# Altium schematic symbol library lib_datalogger.SchLib: 1246 symbols (part 9 of 16)
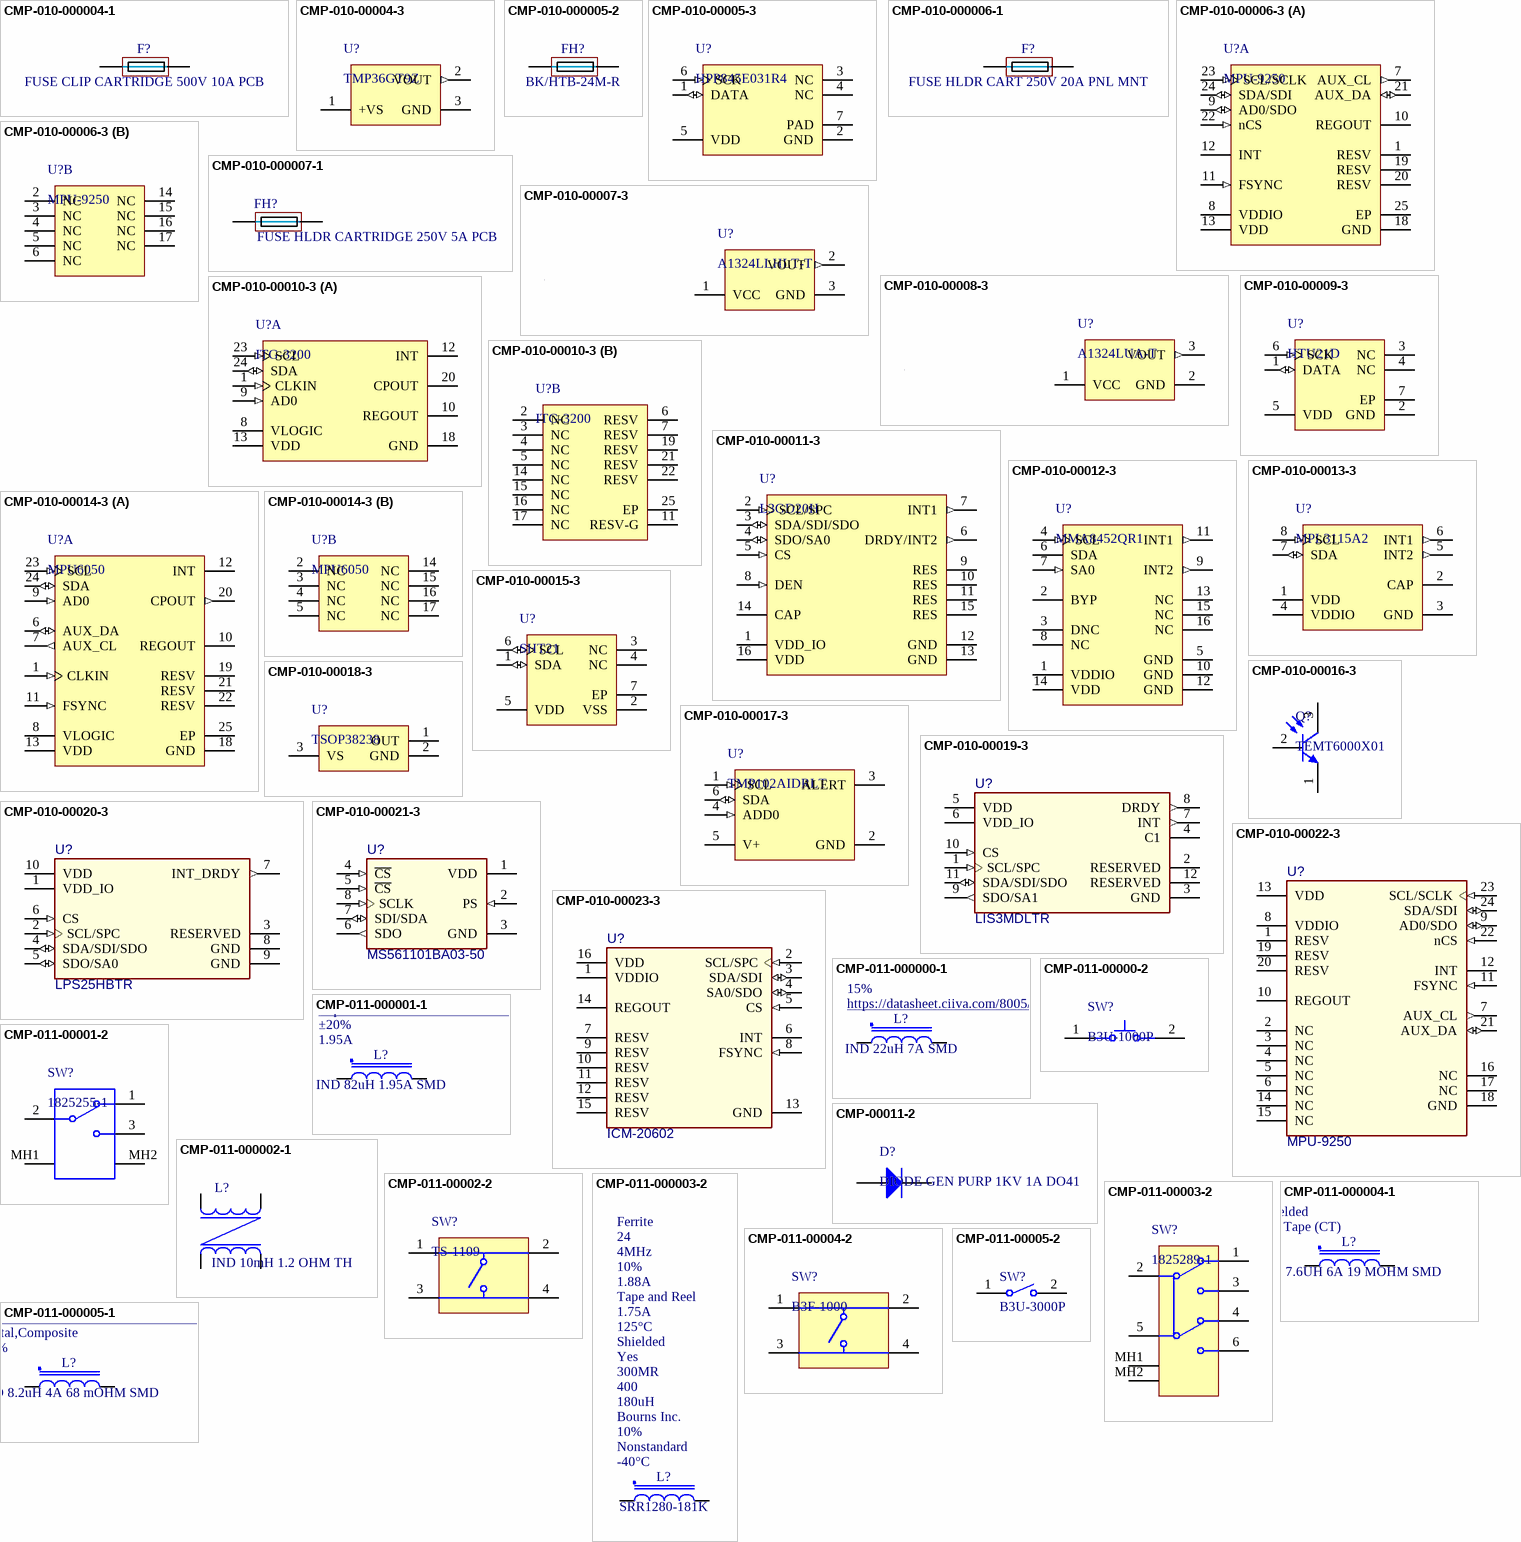
[diagram p51: symbols CMP-010-000004-1 to CMP-011-00005-2]

## CMP-011-00004-2
designator SW?, comment B3F-1000
Tactile Switch, SPST-NO, 0.05 A, 24 V, -25 to 70 degC, 4-Pin THD, RoHS, Bulk; Manufacturer: Omron Electronic Components; Throw Configuration: SPST; Max Contact Resistance: 100mohm; Resistance: 0.1Ohm; Max Current Rating: 50mA; Voltage Rating: 24V; Operating Force: 100gf; Datasheet Version: Jan-15; Case/Package: B3F-1000; Packaging: Bulk; Package Description: 4-Pin Through Hole Device, Body 6 x 6 mm; Manufacturer URL: http://www.omron.com/; Package Reference: B3F-1000; Contact Plating: Gold; Contact Current Rating: 50mA; RoHS Compliant: True; Contact Material: Gold; Mounting Technology: TH; Max Operating Temperature: 70°C; Min Operating Temperature: -25°C; Package Quantity: 1500; Datasheet URL: http://www.omron.com/ecb/products/pdf/en-b3f.pdf; Voltage Rating (DC): 24V; Pins: 4; Current Rating: 50mA; Max Voltage Rating (DC): 24V
footprint OMRON-B3F-1000-4_V (TH, 4-Leads, Body 6x6mm)
pins: 1, 2, 3, 4

## CMP-011-000005-1
designator L?, comment IND 8.2uH 4A 68 mOHM SMD  Inductance Tolerance: 20%  Core Material: Metal,Composite  Max Operating Temperature: 125°C  Shielding: Shielded  Case/Package: 2525  Inductance: 8.2uH  Current Rating: 4A  Packaging: Tape and Reel  Min Operating Temperature: -55°C  Package Quantity: 2000  Self Resonant Frequency: 5MHz  Saturation Current: 7.5A  Manufacturer: Vishay Dale
IHLP 2525 Inductor, 8.2uH, 4A, 64mOhm; Manufacturer Part Number: IHLP2525CZER8R2M01; DC Resistance (DCR): 68mR; Test Frequency: 100kHz; ComponentLink1URL: https://datasheet.ciiva.com/11798/0900766b8102c934-11798421.pdf?src-supplier=RSComponents; ComponentLink3Description: https://datasheet.ciiva.com/8017/lp25cz01-8017605.pdf?src-supplier=Element14; Mount: Surface Mount; ComponentLink6Description: https://datasheet.ciiva.com/3081/lp25cz01-3081990.pdf?src-supplier=Avnet; ComponentLink5URL: https://datasheet.ciiva.com/16348/lp25cz01-16348924.pdf?src-supplier=Future+Electronics; ComponentLink1Description: https://datasheet.ciiva.com/11798/0900766b8102c934-11798421.pdf?src-supplier=RSComponents; Radiation Hardening: No; Height - Seated (Max): 0.118inch; Max DC Current: 7.5A; Contact Plating: Tin; REACH SVHC: Unknown; RMS Current (Irms): 4A; ComponentLink4Description: https://datasheet.ciiva.com/17269/lp25cz01-17269445.pdf?src-supplier=Avnet+Europe; Width: 6.47mm; Stock 1: 10573; ComponentLink5Description: https://datasheet.ciiva.com/16348/lp25cz01-16348924.pdf?src-supplier=Future+Electronics; Design Item ID: IND 8.2uH 4A 68 mOHM SMD; Lead Free: Lead Free; ComponentLink2URL: https://datasheet.ciiva.com/26793/ihlp2525czer8r2m01-26793549.pdf?src-supplier=IIIC; RoHS: Yes; Source: mits.SchLib; Pricing 1: 1=2,73000, 10=2,51900, 100=1,76300, 500=1,42716, 1000=1,30123 (USD); Tolerance: 20%; Termination: SMD/SMT; Number of Pins: 2; ComponentLink4URL: https://datasheet.ciiva.com/17269/lp25cz01-17269445.pdf?src-supplier=Avnet+Europe; ComponentLink3URL: https://datasheet.ciiva.com/8017/lp25cz01-8017605.pdf?src-supplier=Element14; Depth: 6.72mm; Height: 3mm; ComponentLink7Description: https://datasheet.ciiva.com/46393/1913191-46393003.pdf?src-supplier=Element14; ComponentLink2Description: https://datasheet.ciiva.com/26793/ihlp2525czer8r2m01-26793549.pdf?src-supplier=IIIC; Category: Ferrite Beads and Chips; ComponentLink7URL: https://datasheet.ciiva.com/46393/1913191-46393003.pdf?src-supplier=Element14; Length: 7.24mm; ComponentLink6URL: https://datasheet.ciiva.com/3081/lp25cz01-3081990.pdf?src-supplier=Avnet; Military Standard: Not
footprint IND 6.47MM_6.47MM
pins: 1, 2

## CMP-011-00005-2
designator SW?, comment B3U-3000P
Tactile Switch, SPST-NO, 0.05 A, 12 V, -25 to 70 degC, 2-Pin SMD, RoHS, Tape and Reel; Manufacturer: Omron Electronic Components; Operating Force: 162gf; Voltage Rating (DC): 12V; Current Rating: 50mA; IP Rating: IP40; Throw Configuration: SPST; Max Contact Resistance: 100mohm; RoHS Compliant: True; Contact Current Rating: 50mA; Manufacturer URL: http://www.omron.com/; Packaging: TapeandReel; Max Voltage Rating (DC): 12V; Contact Material: Silver; Datasheet Version: Jan-15; Package Reference: B3U-3000P; Package Description: 2-Pin Surface Mount Device, Body 4 x 3.2 mm; Min Operating Temperature: -25°C; Package Quantity: 4000; Max Operating Temperature: 70°C; Max Current Rating: 50mA; Voltage Rating: 12V; Case/Package: B3U-3000P; Mounting Technology: SM; Datasheet URL: https://www.omron.com/ecb/products/pdf/en-b3u.pdf
footprint OMRON-B3U-3000P_V (SMD, 2-Leads, Body 4x3.2mm)
pins: 1, 2

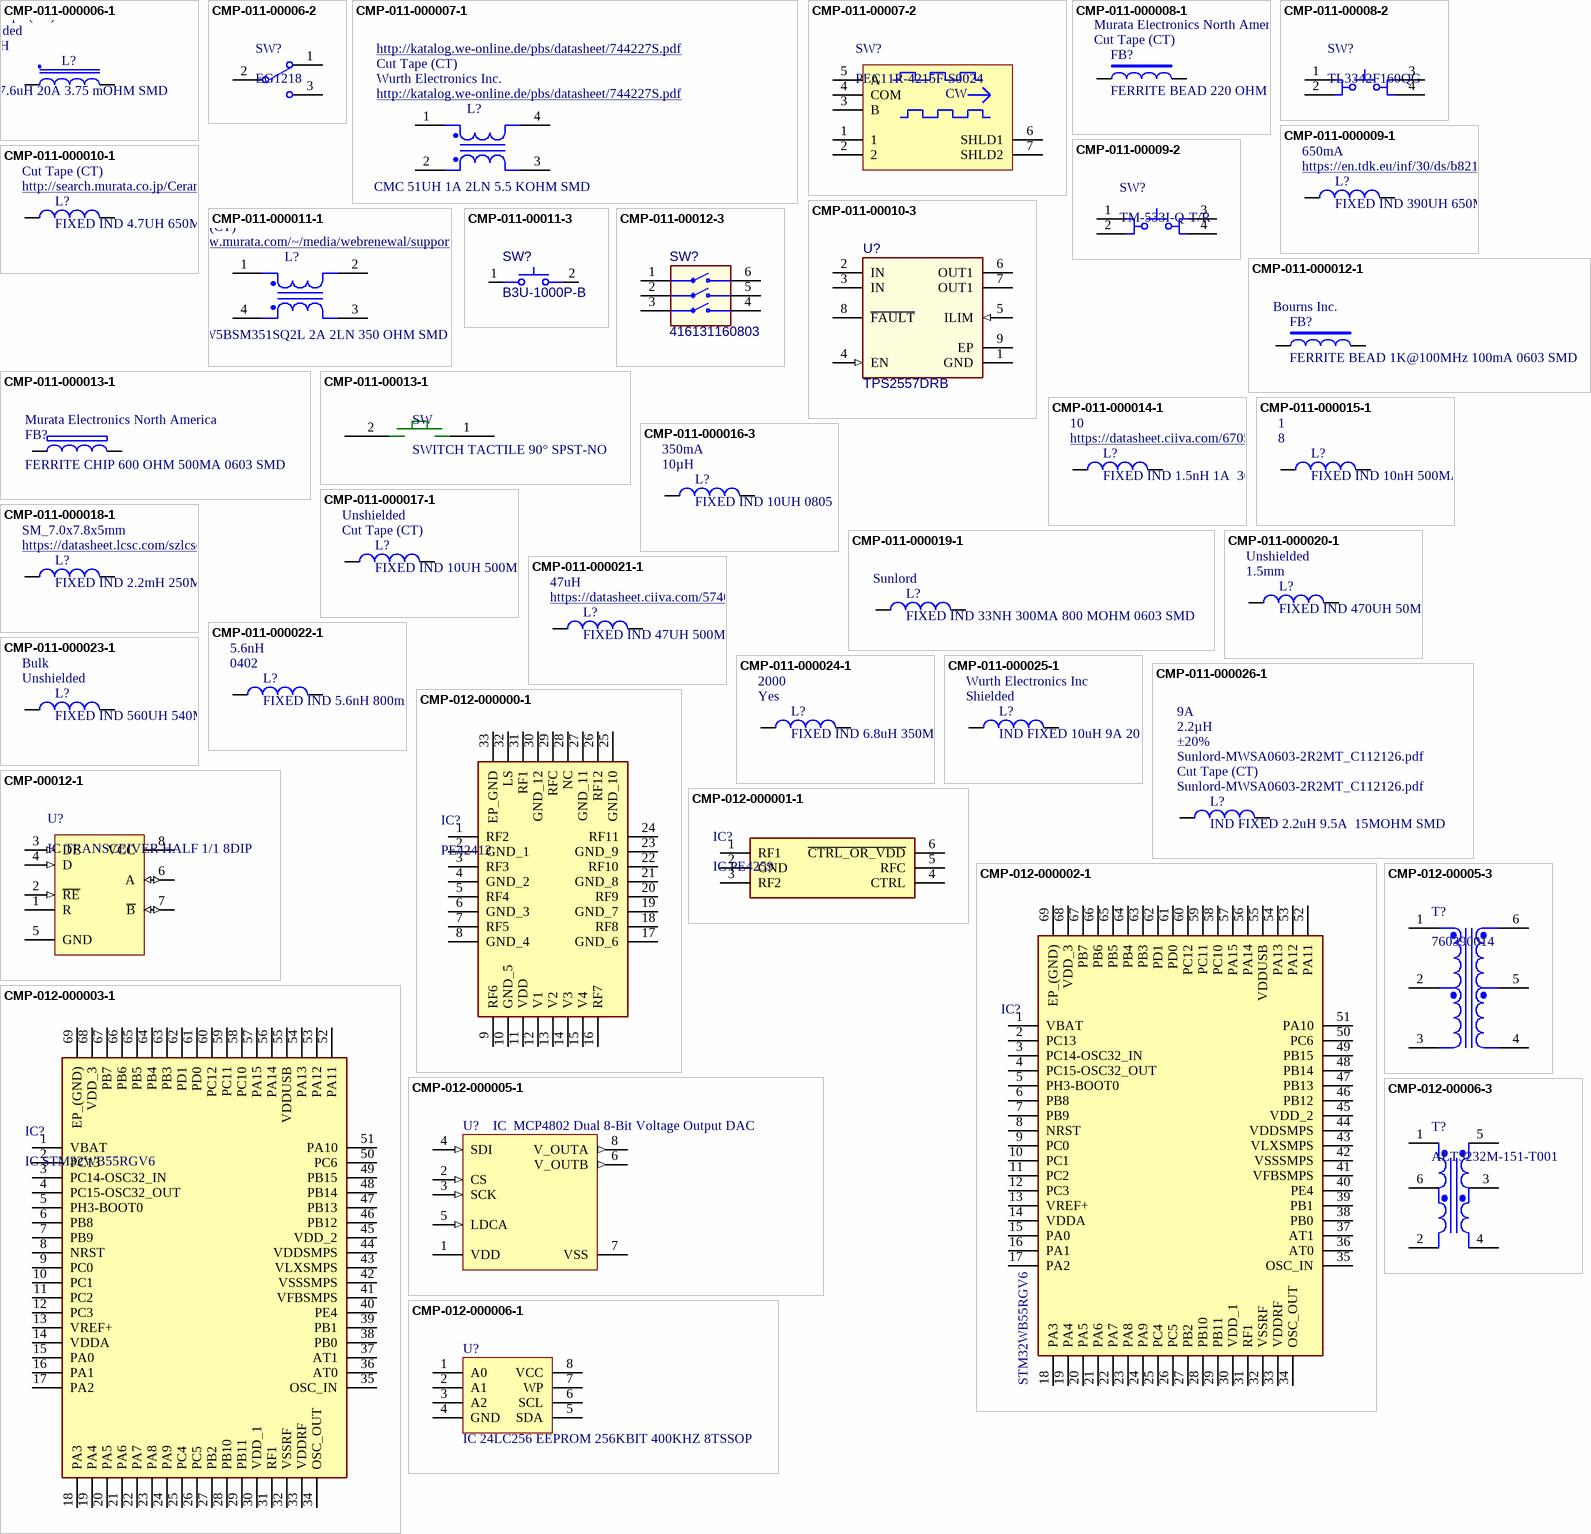
[diagram p23: symbols CMP-011-000006-1 to CMP-012-00006-3]

## CMP-011-000006-1
designator L?, comment IND 7.6uH 20A 3.75 mOHM SMD  Inductance: 7.6µH  Shielding: Shielded  Packaging: Cut Tape (CT)  Current Rating: 20A  Manufacturer: Wurth Electronics Inc  Tolerance: ±20%
FIXED IND 7.6UH 20A 3.75 MOHM; Manufacturer Part Number: 7443557760; Current - Saturation: 20.5A; Type: Wirewound; Material - Core: Metal Composite; Frequency - Test: 100kHz; Frequency - Self Resonant: 20MHz; Operating Temperature: -40°C ~ 125°C; DC Resistance (DCR): 3.75 mOhm; Source: mits.SchLib; Ratings: -; Category: Inductors, Coils, Chokes; Mounting Type: Surface Mount; Q @ Freq: -; Design Item ID: IND 7.6uH 20A 3.75 mOHM SMD; Size / Dimension: 0.720" L x 0.717" W (18.30mm x 18.20mm); Height - Seated (Max): 0.362" (9.20mm); Stock 1: 825; Pricing 1: 1=5.5, 10=5.387, 50=4.766 (USD); Package / Case: Nonstandard; ComponentLink1Description: http://katalog.we-online.de/pbs/datasheet/7443557760.pdf; RoHS: RoHS Compliant; ComponentLink1URL: http://katalog.we-online.de/pbs/datasheet/7443557760.pdf
pins: 1, 2

## CMP-011-00006-2
designator SW?, comment EG1218
Slide Switch, SPDT, 500 V, -20 to 70 degC, 3-Pin THD, RoHS, Bulk; Manufacturer: E-Switch; Voltage Rating (DC): 30V; Current Rating: 200mA; Operating Force: 250gf; Package Quantity: 1000; Contact Plating: Silver; Max Operating Temperature: 70°C; Min Operating Temperature: -20°C; Contact Material: Copper; Datasheet URL: https://www.e-switch.com/system/asset/product_line/data_sheet/119/EG.pdf; Contact Finish: Silver; Case/Package: EG1218; Voltage Rating (AC): 30V; Datasheet Version: Oct-15; Package Description: 3-Pin Through Hole Device, Body 11.6 x 4 mm, Pitch 2.5 mm; RoHS Compliant: True; Package Reference: EG1218; Manufacturer URL: http://www.e-switch.ch/en/; Throw Configuration: SPDT; Contact Current Rating: 200mA; Mounting Technology: TH; Packaging: Bulk; Pins: 3
footprint ESWI-EG1218_V (THD, 3-Leads, Body 11.6x4mm, Pitch 2.5mm)
pins: 1, 2 COM, 3

## CMP-011-000007-1
designator L?, comment CMC 51UH 1A 2LN 5.5 KOHM SMD  Manufacturer: Wurth Electronics Inc.  Packaging: Cut Tape (CT)
Manufacturer Part Number: 744227S; DC Resistance (DCR) (Max): 160 mOhm; Number of Lines: 2; Voltage Rating - DC: 80V; Impedance @ Frequency: 5.5 kOhm @ 1kHz; Filter Type: Power, Signal Line; Inductance @ Frequency: 51µH @ 1kHz; Ratings: -; Features: -; Source: mits.SchLib; Mounting Type: Surface Mount; Size / Dimension: 0.362" L x 0.236" W (9.20mm x 6.00mm); Stock 1: 7295; ComponentLink1URL: http://katalog.we-online.de/pbs/datasheet/744227S.pdf; Part Status: Active; Operating Temperature: -40°C ~ 125°C; Package / Case: Horizontal, 4 PC Pad; Height (Max): 0.209" (5.30mm); Design Item ID: CMC 51UH 1A 2LN 5.5 KOHM SMD; Category: Filters; Pricing 1: 1=2.8, 10=2.713, 50=2.45, 100=2.3625, 500=2.1875 (USD); Voltage Rating - AC: -; Current Rating (Max): 1A; RoHS: RoHS Compliant; Approvals: -; ComponentLink1Description: http://katalog.we-online.de/pbs/datasheet/744227S.pdf
footprint CMC
footprint CMC
pins: 1, 2, 3, 4
1 alternate drawing of the same symbol

## CMP-011-00007-2
designator SW?, comment PEC11R-4215F-S0024
12 mm Incremental Encoder, 24 Detent, -30 to 70 degC, 5-Pin THD, RoHS, Bulk; Manufacturer: Bourns; Channels: 2; RoHS Compliant: True; Product Type: Mechanical; Datasheet Version: Jul-14; Package Quantity: 150; Manufacturer URL: http://www.bourns.com/; Case/Package: PEC11R-4XXXF-SXXXX; Packaging: Bulk; Package Reference: PEC11R-4XXXF-SXXXX; Min Operating Temperature: -30°C; Max Operating Temperature: 70°C; Datasheet URL: http://www.bourns.com/docs/Product-Datasheets/PEC11R.pdf; Mounting Technology: TH; Package Description: 5-Pin Through Hole Device, Body 12.5 x 13.4 mm
footprint BOUR-PEC11R-4XXXF-SXXXX_V (THD, 5-Leads, Body 12.5x13.4mm)
pins: 1, 2, 3 B "Channel B", 4 COM "Common", 5 A "Channel A", 6 SHLD1, 7 SHLD2
text: CW

## CMP-011-000008-1
designator FB?, comment FERRITE BEAD 220 OHM 0805 1LN  Packaging: Cut Tape (CT)  Manufacturer: Murata Electronics North America
Manufacturer Part Number: BLM21PG221SN1D; Impedance @ Frequency: 220 Ohm @ 100MHz; Number of Lines: 1; Current Rating (Max): 2A; DC Resistance (DCR) (Max): 45 mOhm; Filter Type: Power Line; Mounting Type: Surface Mount; Pricing 1: 1=0.1, 10=0.081, 25=0.0732, 50=0.0538, 100=0.0464, 250=0.03664, 500=0.03094, 1000=0.02605 (USD); Package / Case: 0805 (2012 Metric); Height (Max): 0.041" (1.05mm); Category: Filters; Ratings: -; Design Item ID: FERRITE BEAD 220 OHM 0805 1LN; RoHS: RoHS Compliant; Part Status: Active; Source: mits.SchLib; ComponentLink1URL: http://www.murata.com/en-us/products/productdata/8796738977822/ENFA0005.pdf; ComponentLink1Description: http://www.murata.com/en-us/products/productdata/8796738977822/ENFA0005.pdf; Operating Temperature: -55°C ~ 125°C; Size / Dimension: 0.079" L x 0.049" W (2.00mm x 1.25mm); Stock 1: 1042691
footprint CI1608-0603 (Chip Inductor; Body 1.6 x 0.8 mm (LxW typ))
footprint FC2012-0805 (Ferrite Chip)
pins: 1, 2

## CMP-011-00008-2
designator SW?, comment TL3342F160QG
Tactile Switch, SPST-NO, 50 mA, 12 V, 4-Pin SMD, RoHS, Tape and Reel; Manufacturer: E-Switch; Operating Force: 1.6N; Current Rating: 50mA; Throw Configuration: SPST; Max Voltage Rating (DC): 12V; Datasheet URL: http://spec_sheets.e-switch.com/specs/P010632.pdf; Manufacturer URL: http://www.e-switch.ch/en/; Mounting Technology: SM; Case/Package: TL3342F160QG; Package Quantity: 3000; Contact Material: Silver; Package Description: 4-Pin Surface Mount Device, Body 5 x 5 mm, Pitch 6.3 mm; Package Reference: TL3342F160QG; Datasheet Version: Rev. I, 12/2010; Voltage Rating (DC): 12V; Contact Plating: Silver; RoHS Compliant: True; Packaging: TapeandReel
footprint ESWI-TL3342F160QG_V (SMD, 4-Leads, Body 5x5mm, Pitch 6.3mm)
pins: 1, 2, 3, 4

## CMP-011-000009-1
designator L?, comment FIXED IND 390UH 650MA 1.72 OHM  Current Rating: 650mA  Tolerance: ±5%  Packaging: Cut Tape (CT)  Inductance: 390µH  Shielding: Unshielded  Manufacturer: EPCOS (TDK)
Manufacturer Part Number: B82144F2394J; Frequency - Self Resonant: 2.5MHz; DC Resistance (DCR): 1.72 Ohm Max; Q @ Freq: 40 @ 79.6kHz; Type: Wirewound; Material - Core: Ferrite; Current - Saturation: 480mA; Frequency - Test: 100kHz; ComponentLink1URL: https://en.tdk.eu/inf/30/ds/b82144f2.pdf; Mounting Type: Through Hole; Supplier Device Package: Axial; Ratings: -; Operating Temperature: -55°C ~ 125°C; Stock 1: 2989; Part Status: Active; ComponentLink1Description: https://en.tdk.eu/inf/30/ds/b82144f2.pdf; RoHS: RoHS Compliant; Design Item ID: FIXED IND 390UH 650MA 1.72 OHM; Package / Case: Axial; Source: mits.SchLib; Category: Inductors, Coils, Chokes; Height - Seated (Max): -; Pricing 1: 1=0.94, 10=0.836, 100=0.627, 500=0.5434 (USD); Size / Dimension: 0.256" Dia x 0.362" L (6.50mm x 9.20mm)
footprint IND 6.6MM_7.1MM
footprint AXIAL_P15mm
pins: 1, 2

## CMP-011-00009-2
designator SW?, comment TM-533I-Q-T/R
Tactile Switch, SPNO, -25 to 70 degC, 4-Pin SMD, RoHS, Tape and Reel; Manufacturer: Multicomp; Operating Force: 160gf; Max Contact Resistance: 100mohm; Resistance: 0.1Ohm; Package Reference: TM-533I-Q-T/R; Mounting Technology: SM; Min Operating Temperature: -25°C; Max Operating Temperature: 70°C; RoHS Compliant: True; Package Description: 4-Pin Surface Mount Device, Body 5.2 x 5.2 mm; Case/Package: TM-533I-Q-T/R; Datasheet URL: http://www.micropik.com/PDF/pul5x5.pdf; Datasheet Version: Rev. 1.1, 12/2011
footprint MULT-TM-533I-Q_V (SMD, 4-Leads, Body 5.2x5.2mm)
pins: 1, 2, 3, 4

## CMP-011-000010-1
designator L?, comment FIXED IND 4.7UH 650MA 150 MOHM  Packaging: Cut Tape (CT)  Inductance: 4.7µH  Shielding: Unshielded  Tolerance: ±20%  Manufacturer: Murata Electronics North America  Current Rating: 650mA
Manufacturer Part Number: LQH32CN4R7M53L; Type: Wirewound; Frequency - Self Resonant: 43MHz; Frequency - Test: 1MHz; DC Resistance (DCR): 195 mOhm Max; Material - Core: Ferrite; Design Item ID: FIXED IND 4.7UH 650MA 150 MOHM; Part Status: Active; ComponentLink1URL: http://search.murata.co.jp/Ceramy/image/img/PDF/ENG/L0075S0093LQH32C_53.pdf; Size / Dimension: 0.126" L x 0.098" W (3.20mm x 2.50mm); Operating Temperature: -40°C ~ 85°C; Category: Inductors, Coils, Chokes; Package / Case: Nonstandard; Mounting Type: Surface Mount; Pricing 1: 1=0.35, 10=0.317, 25=0.2816, 50=0.2464, 100=0.2288, 250=0.2112, 500=0.20064, 750=0.18304, 1000=0.16192 (USD); Height - Seated (Max): 0.067" (1.70mm); Current - Saturation: -; Source: mits.SchLib; RoHS: RoHS Compliant; Ratings: -; Q @ Freq: -; Stock 1: 9364; Supplier Device Package: 1210; ComponentLink1Description: http://search.murata.co.jp/Ceramy/image/img/PDF/ENG/L0075S0093LQH32C_53.pdf
footprint IND 6.6MM_7.1MM
footprint CI3225
pins: 1, 2

## CMP-011-00010-3
designator U?, comment TPS2557DRB
Precision Adjustable Current-Limited Power-Distribution Switch, 0.5 to 5.0 A Current Limit, -40 to 85 degC, 8-pin SON (DRB), Green (RoHS & no Sb/Br); ComponentLink1Description: Datasheet; ComponentLink1URL: http://www.ti.com/general/docs/lit/getliterature.tsp?genericPartNumber=TPS2557&fileType=pdf; Mounting Technology: Surface Mount; Pins: 9; Case/Package: 8-Pin Plastic Small Outline No-Lead, 3 x 3 x 1 mm Body, 0.65 mm Pitch, Exposed Pad
footprint DRB0008B_V (SON, 8-Leads, Body 3x3mm, Pitch 0.65mm, Thermal Pad 2.4x1.65mm, TI Recommended)
footprint DRB0008B_V (SON, 8-Leads, Body 3x3mm, Pitch 0.65mm, Thermal Pad 2.4x1.65mm, TI Recommended)
pins: 1 GND (power) "Ground connection; connect externally to PowerPAD", 2 IN (power) "Input voltage; connect a 0.1 uF or greater ceramic capacitor from IN to GND as close to the IC as possible.", 3 IN (power) "Input voltage; connect a 0.1 uF or greater ceramic capacitor from IN to GND as close to the IC as possible.", 4 EN (in) "Enable input, logic high turns on power switch", 5 ILIM (in) "External resistor used to set current-limit threshold; recommended 20 k ohm =< RILIM =< 187 k ohm", 6 OUT1 (power) "Power-switch output", 7 OUT1 (power) "Power-switch output", 8 ~{FAULT} (hiz) "Active-low open-drain output, asserted during overcurrent or overtemperature conditions.", 9 EP (power) "Internally connected to GND; used to heat-sink the part to the circuit board traces. Connect PowerPAD to GND pin externally."

## CMP-011-000011-1
designator L?, comment CMC DLW5BSM351SQ2L 2A 2LN 350 OHM SMD  Packaging: Cut Tape (CT)  Manufacturer: Murata Electronics North America
CMC 2A 2LN 350 OHM SMD; Filter Type: Power, Signal Line; Impedance @ Frequency: 350 Ohm @ 100MHz; DC Resistance (DCR) (Max): 40 mOhm; Voltage Rating - DC: 50V; Number of Lines: 2; Inductance @ Frequency: -; Height (Max): 0.177" (4.50mm); ComponentLink1URL: http://www.murata.com/~/media/webrenewal/support/library/catalog/products/emc/emifil/c31e.ashx; Ratings: -; Operating Temperature: -40°C ~ 85°C; Approvals: -; Mounting Type: Surface Mount; Current Rating (Max): 2A; ComponentLink1Description: http://www.murata.com/~/media/webrenewal/support/library/catalog/products/emc/emifil/c31e.ashx; Features: -; Voltage Rating - AC: -; Package / Case: Horizontal, 4 PC Pad; Stock 1: 556; Category: Filters; Design Item ID: CMC DLW5BSM351SQ2L 2A 2LN 350 OHM SMD; Size / Dimension: 0.197" L x 0.197" W (5.00mm x 5.00mm); Part Status: Active; Manufacturer Part Number: DLW5BSM351SQ2L; Source: mits.SchLib; Pricing 1: 1=2.1, 10=1.937, 25=1.7756, 50=1.5174, 100=1.3559 (USD); RoHS: RoHS Compliant
footprint DLW5BS (DLW5BS Series)
footprint DLW5BS (DLW5BS Series)
pins: 1, 2, 3, 4
1 alternate drawing of the same symbol

## CMP-011-00011-3
designator SW?, comment B3U-1000P-B
Ultra-small Surface-mounting Tactile Switches with High Contact Reliability, SPST-NO, -25 to 70 degC, 2-Pin SMD, RoHS, Tape and Reel; Voltage Rating: 12V; Current Rating: 50mA; Pins: 2; RoHS Compliant: Details
footprint OMRON-B3U-1000P-2-B_V (SMT, 2-Leads, Body 3x2.5mm)
footprint OMRON-B3U-1000P-2-B_V (SMT, 2-Leads, Body 3x2.5mm)
pins: 1, 2

## CMP-011-000012-1
designator FB?, comment FERRITE BEAD 1K@100MHz 100mA 0603 SMD  Manufacturer: Bourns Inc.
BEAD FERRITE 1000 OHM 100MA 1608; Part#: MZ1608-102Y; MSRP: 0,01672; eVendorPrice: 0,10; eVendor: Digi-Key; eVendor#: MZ1608-102YCT-ND; Design Item ID: FERRITE BEAD 1K@100MHz 100mA 0603 SMD; Datasheet: http://www.bourns.com/data/global/pdfs/mgmumz.pdf; Source: mits.SchLib; MOQ: 1000
footprint CI1608-0603 (Chip Inductor; Body 1.6 x 0.8 mm (LxW typ))
footprint CI1608-0603 (Chip Inductor; Body 1.6 x 0.8 mm (LxW typ))
pins: 1, 2

## CMP-011-00012-3
designator SW?, comment 416131160803
WS-DISV 1.27 mm small compact SMD Dip Switch with top tape; ComponentLink1Description: Manufacturer URL; ComponentLink2Description: Datasheet; ComponentLink2URL: http://katalog.we-online.de/em/datasheet/4161311608xx.pdf; Pins: 6; ComponentLink1URL: http://www.we-online.com
footprint 416131160803 (03p, 1.27mm Pitch, Horizontal, HP Type, SMT, flat Actuator, black, with Tape, T&R)
footprint 416131160803 (03p, 1.27mm Pitch, Horizontal, HP Type, SMT, flat Actuator, black, with Tape, T&R)
pins: 1, 2, 3, 4, 5, 6

## CMP-011-000013-1
designator FB?, comment FERRITE CHIP 600 OHM 500MA 0603 SMD  Manufacturer: Murata Electronics North America
FERRITE CHIP 600 OHM 500MA 0603; Part#: BLM18AG601SN1D; eVendor#: 490-1014-1-ND; MSRP: 0,02738; eVendorPrice: 0,10; eVendor: Digi-Key; Design Item ID: FERRITE CHIP 600 OHM 500MA 0603 SMD; MOQ: 1000; Datasheet: http://search.murata.co.jp/Ceramy/image/img/PDF/ENG/L0110S0100BLM18A.pdf; Source: mits.SchLib
footprint CI1608-0603 (Chip Inductor; Body 1.6 x 0.8 mm (LxW typ))
footprint CI1608-0603 (Chip Inductor; Body 1.6 x 0.8 mm (LxW typ))
pins: 1, 2

## CMP-011-00013-1
designator SW, comment SWITCH TACTILE 90° SPST-NO
SWITCH TACTILE SPST-NO 0.05A 12V; Manufacturer Part Number: TL1105WF250Q; Direction: RIGHT; Max Voltage Rating (DC): 50V; Switch Function: Off-Mom; Contact Current Rating: 50mA; Mechanical Life: 100000Cycles; Contact Resistance: 100mR; Operating Force: 250gf; Actuator Length: 0.6mm; Throw Configuration: SPST; Actuator Type: Standard; Switch Travel: 0.25mm; Actuator Material: Nylon,Polyamide; Illumination Type: Non-Illuminated,Illuminated; Size: 6mm; Voltage Rating (DC): 12V; Electrical Life: 100000Cycles; Contact Plating: Silver; Series: TL1105; Housing Material: Nylon; Package Quantity: 1000; RoHS Compliant: Yes; Max Operating Temperature: 70°C; Mount: Through Hole; Contact Material: Bronze,Silver; Min Operating Temperature: -20°C; Current Rating: 50mA; REACH SVHC: No SVHC; Lead Free: Lead Free; Termination: PC Pin; Packaging: Bulk; Orientation: Right Angle
footprint TL1105WF250Q-Footprint-1
pins: 1, 2

## CMP-011-000014-1
designator L?, comment FIXED IND 1.5nH 1A  30mOHM 0402 SMD  Q Factor: 10  Core Material: Air,Non-Magnetic,Ferrite  Current Rating: 1A  Self Resonant Frequency: 18GHz  Shielding: Unshielded  Packaging: Tape and Reel  Inductance: 1.5nH  Manufacturer: Murata  RoHS Compliant: Yes  Case/Package: 0402  Min Operating Temperature: -55°C  Package Quantity: 10000  Max Operating Temperature: 125°C
INDUCTOR, 1.5NH, 1A, 0.2NH, 18GHZ; Product Range:LQW15A_00 Series; Inductance:1.5nH; Inductance Tolerance: 0.2nH; High Frequency Inductor Case:0402 [1005 Metric]; Self Resonant Frequency Min:18GHz; DC Resistance Max:0.03ohm ;RoHS Compliant: Yes; Manufacturer Part Number: LQW15AN1N5C00D; Current: 850mA; Test Frequency: 100MHz; DC Resistance (DCR): 30mR; ComponentLink6Description: https://datasheet.ciiva.com/4977/product-4977068.pdf?src-supplier=Mouser; Termination: SMD/SMT; ComponentLink2Description: https://datasheet.ciiva.com/6705/l0075s0080lqw15a-00-6705437.pdf?src-supplier=Digi-Key; Resistor Type: Wirewound; ComponentLink4URL: https://datasheet.ciiva.com/6705/l0075s0080lqw15a-00-6705439.pdf?src-supplier=Digi-Key; Width: 0.5mm; Depth: 0.7mm; Radiation Hardening: No; Design Item ID: FIXED IND 1.5nH 1A  30mOHM 0402 SMD; Height: 0.5mm; ComponentLink3URL: https://datasheet.ciiva.com/6705/l0075s0080lqw15a-00-6705438.pdf?src-supplier=Digi-Key; ComponentLink1URL: https://datasheet.ciiva.com/11799/0900766b8090d800-11799086.pdf?src-supplier=RSComponents; ComponentLink7URL: https://datasheet.ciiva.com/16207/l0075s0080lqw15a-00-16207903.pdf?src-supplier=Future+Electronics; ComponentLink5Description: https://datasheet.ciiva.com/8510/l0075s0080lqw15a-00-8510411.pdf?src-supplier=Avnet; Lead Free: Lead Free; Case Code (Imperial): 0402; DC Current: 1A; ComponentLink8Description: https://datasheet.ciiva.com/17277/l0075s0080lqw15a-00-17277867.pdf?src-supplier=Avnet+Europe; Case Code (Metric): 1005; Max DC Current: 1A; Source: mits.SchLib; RoHS: Yes; Pricing 1: 10=0,06030, 100=0,04640, 300=0,04400, 1000=0,04130, 5000=0,04020, 10000=0,03960, 10=0,05800, 100=0,04460, 300=0,04220, 1000=0,03970, 5000=0,03860, 10000=0,03810, 10=0,30190, 100=0,23250, 300=0,22010, 1000=0,20700, 5000=0,20110, 10000=0,19850, 10=0,28790, 100=0,22170, 300=0,20990, 1000=0,19740, 5000=0,19180, 10000=0,18930, 10=0,03870, 100=0,02980, 300=0,02820, 1000=0,02650, 5000=0,02580, 10000=0,02540, 10=0,03360, 100=0,02580, 300=0,02450, 1000=0,02300, 5000=0,02240, 10000=0,02210, 10=0,35860, 100=0,27610, 300=0,26130, 1000=0,24580, 5000=0,23880, 10000=0,23570, 10=5,03750, 100=3,87920, 300=3,67160, 1000=3,45310, 5000=3,35470, 10000=3,31100, 10=0,19070, 100=0,14680, 300=0,13900, 1000=0,13070, 5000=0,12700, 10000=0,12530, 10=3,54660, 100=2,73110, 300=2,58500, 1000=2,43110, 5000=2,36180, 10000=2,33110, 10=0,39400, 100=0,30340, 300=0,28720, 1000=0,27010, 5000=0,26240, 10000=0,25900, 10=0,06180, 100=0,04760, 300=0,04500, 1000=0,04230, 5000=0,04110, 10000=0,04060, 10=0,04610, 100=0,03550, 300=0,03360, 1000=0,03160, 5000=0,03070, 10000=0,03030 (AUD); Military Standard: Not; ComponentLink8URL: https://datasheet.ciiva.com/17277/l0075s0080lqw15a-00-17277867.pdf?src-supplier=Avnet+Europe; ComponentLink7Description: https://datasheet.ciiva.com/16207/l0075s0080lqw15a-00-16207903.pdf?src-supplier=Future+Electronics; ComponentLink3Description: https://datasheet.ciiva.com/6705/l0075s0080lqw15a-00-6705438.pdf?src-supplier=Digi-Key; ComponentLink5URL: https://datasheet.ciiva.com/8510/l0075s0080lqw15a-00-8510411.pdf?src-supplier=Avnet; Number of Pins: 2; ComponentLink6URL: https://datasheet.ciiva.com/4977/product-4977068.pdf?src-supplier=Mouser; Category: Fixed Inductors; Stock 1: 16160; ComponentLink2URL: https://datasheet.ciiva.com/6705/l0075s0080lqw15a-00-6705437.pdf?src-supplier=Digi-Key; ComponentLink4Description: https://datasheet.ciiva.com/6705/l0075s0080lqw15a-00-6705439.pdf?src-supplier=Digi-Key; REACH SVHC: No SVHC; ComponentLink1Description: https://datasheet.ciiva.com/11799/0900766b8090d800-11799086.pdf?src-supplier=RSComponents; Height - Seated (Max): 0.024inch; Weight: 2.8E-05oz; Length: 1mm; Mount: Surface Mount
footprint IND 6.6MM_7.1MM
footprint CI1005-0402 (Chip Capacitor; Body 0.039" L x 0.020" W (1.00mm x 0.50mm))
pins: 1, 2

## CMP-011-000015-1
designator L?, comment FIXED IND 10nH 500MA  290MOHM 0402 SMD  Q Factor: 8  Package Quantity: 1  RoHS Compliant: Yes  Tolerance: 5%  Packaging: Tape and Reel  Max Operating Temperature: 125°C  Min Operating Temperature: -55°C  Shielding: Unshielded  Self Resonant Frequency: 3.2GHz  Manufacturer: Murata  Core Material: Air  Current Rating: 300mA  Case/Package: 0402  Inductance: 10nH
MURATA LQG15HN10NJ02D  10 nH,  5%, 0402 [1005 Metric], 3.2 GHz; Test Frequency: 100MHz; DC Resistance (DCR): 350mR; Height - Seated (Max): 0.022inch; ComponentLink7URL: https://datasheet.ciiva.com/8002/66026-8002495.pdf?src-supplier=Element14; Pricing 1: 50=0,01110, 500=0,00840, 1500=0,00780, 5000=0,00730, 25000=0,00710, 50000=0,00710, 50=0,01070, 500=0,00810, 1500=0,00760, 5000=0,00710, 25000=0,00680, 50000=0,00680, 50=0,05580, 500=0,04200, 1500=0,03940, 5000=0,03680, 25000=0,03550, 50000=0,03550, 50=0,05370, 500=0,04040, 1500=0,03790, 5000=0,03540, 25000=0,03410, 50000=0,03410, 50=0,00720, 500=0,00540, 1500=0,00510, 5000=0,00480, 25000=0,00460, 50000=0,00460, 50=0,00620, 500=0,00460, 1500=0,00440, 5000=0,00410, 25000=0,00390, 50000=0,00390, 50=0,06610, 500=0,04980, 1500=0,04660, 5000=0,04350, 25000=0,04200, 50000=0,04200, 50=0,93390, 500=0,70310, 1500=0,65920, 5000=0,61520, 25000=0,59330, 50000=0,59330, 50=0,03520, 500=0,02650, 1500=0,02490, 5000=0,02320, 25000=0,02240, 50000=0,02240, 50=0,64300, 500=0,48420, 1500=0,45390, 5000=0,42360, 25000=0,40850, 50000=0,40850, 50=0,07380, 500=0,05560, 1500=0,05210, 5000=0,04860, 25000=0,04690, 50000=0,04690, 50=0,01150, 500=0,00860, 1500=0,00810, 5000=0,00750, 25000=0,00730, 50000=0,00730, 50=0,00850, 500=0,00640, 1500=0,00600, 5000=0,00560, 25000=0,00540, 50000=0,00540 (AUD); ComponentLink3URL: https://datasheet.ciiva.com/17247/l0075s0083lqg15hn-17247084.pdf?src-supplier=Avnet+Europe; Rated Current-Max: 300mA; Case Code (Imperial): 0402; ComponentLink4Description: https://datasheet.ciiva.com/29696/l0075s0083lqg15hn-29696693.pdf?src-supplier=Digi-Key; Width: 0.5mm; ComponentLink1Description: https://datasheet.ciiva.com/11801/0900766b80f10808-11801402.pdf?src-supplier=RSComponents; Mount: Surface Mount; ComponentLink2URL: https://datasheet.ciiva.com/1063/l0075s0083lqg15hn-1063848.pdf?src-supplier=Digi-Key; Stock 1: 5750; RoHS: Yes; ComponentLink3Description: https://datasheet.ciiva.com/17247/l0075s0083lqg15hn-17247084.pdf?src-supplier=Avnet+Europe; Manufacturer Part Number: LQG15HN10NJ02D; DC Current: 300mA; ComponentLink6Description: https://datasheet.ciiva.com/16444/l0075s0083lqg15hn-16444366.pdf?src-supplier=Future+Electronics; ComponentLink4URL: https://datasheet.ciiva.com/29696/l0075s0083lqg15hn-29696693.pdf?src-supplier=Digi-Key; Length: 0.039inch; Category: Fixed Inductors; ComponentLink5URL: https://datasheet.ciiva.com/8002/66026-8002493.pdf?src-supplier=Element14; Series: LQG15HS; ComponentLink5Description: https://datasheet.ciiva.com/8002/66026-8002493.pdf?src-supplier=Element14; Termination: SMD/SMT; Radiation Hardening: No; Inductance Tolerance: 5%; Depth: 0.55mm; Height: 0.02inch; Design Item ID: FIXED IND 10nH 500MA  290MOHM 0402 SMD; ComponentLink1URL: https://datasheet.ciiva.com/11801/0900766b80f10808-11801402.pdf?src-supplier=RSComponents; Max DC Current: 300mA; ComponentLink6URL: https://datasheet.ciiva.com/16444/l0075s0083lqg15hn-16444366.pdf?src-supplier=Future+Electronics; Source: mits.SchLib; ComponentLink2Description: https://datasheet.ciiva.com/1063/l0075s0083lqg15hn-1063848.pdf?src-supplier=Digi-Key; ComponentLink7Description: https://datasheet.ciiva.com/8002/66026-8002495.pdf?src-supplier=Element14; REACH SVHC: No SVHC; Military Standard: Not; Lead Free: Lead Free; Case Code (Metric): 1005
footprint IND 6.6MM_7.1MM
footprint CI1005-0402 (Chip Capacitor; Body 0.039" L x 0.020" W (1.00mm x 0.50mm))
pins: 1, 2

## CMP-011-000016-3
designator L?, comment FIXED IND 10UH 0805 SMD  Inductance: 10µH  Current Rating: 350mA  Tolerance: ±20%  Shielding: Shielded  Manufacturer: TDK Corporation  Packaging: Cut Tape (CT)
IND FIXED 10UH 0805 SMD; Manufacturer Part Number: MLZ2012M100WT000; Material - Core: Ferrite; DC Resistance (DCR): 611 mOhm Max; Frequency - Self Resonant: 50MHz; Frequency - Test: 2MHz; Type: Multilayer; Current - Saturation: 200mA; Q @ Freq: -; Source: mits.SchLib; Height - Seated (Max): 0.057" (1.45mm); ComponentLink1URL: https://product.tdk.com/info/en/catalog/datasheets/inductor_commercial_decoupling_mlz2012_en.pdf; Design Item ID: FIXED IND 10UH 350MA 470 MOHM 0805 SMD; Ratings: -; RoHS: RoHS Compliant; ComponentLink1Description: https://product.tdk.com/info/en/catalog/datasheets/inductor_commercial_decoupling_mlz2012_en.pdf; Stock 1: 36030; Category: Inductors, Coils, Chokes; Size / Dimension: 0.079" L x 0.049" W (2.00mm x 1.25mm); Part Status: Active; Package / Case: 0805 (2012 Metric); Operating Temperature: -55°C ~ 125°C; Supplier Device Package: 0805 (2012 Metric); Mounting Type: Surface Mount; Pricing 1: 1=0.14, 10=0.125, 50=0.0976, 100=0.0875, 500=0.075, 1000=0.065 (USD)
footprint IND 6.6MM_7.1MM
footprint CI2012-0805 (Chip Inductor)
pins: 1, 2

## CMP-011-000017-1
designator L?, comment FIXED IND 10UH 500MA 400 MOHM SMD  Packaging: Cut Tape (CT)  Shielding: Unshielded  Tolerance: ±10%  Inductance: 10µH  Current Rating: 500mA  Manufacturer: Murata Power Solutions Inc.
FIXED IND 10UH 500MA 400 MOHM; Manufacturer Part Number: 82103C; Type: Wirewound; DC Resistance (DCR): 400 mOhm Max; Q @ Freq: 35 @ 1MHz; Frequency - Test: 10kHz; Frequency - Self Resonant: 38MHz; Material - Core: -; Source: mits.SchLib; Stock 1: 4288; Pricing 1: 1=0.32, 25=0.3108, 50=0.283 (USD); Supplier Device Package: 1210; RoHS: RoHS Compliant; Ratings: -; Current - Saturation: -; Size / Dimension: 0.126" L x 0.098" W (3.20mm x 2.50mm); Category: Inductors, Coils, Chokes; Mounting Type: Surface Mount; Package / Case: 1210 (3225 Metric); Part Status: Active; Height - Seated (Max): 0.091" (2.30mm); ComponentLink1Description: http://www.murata-ps.com/data/magnetics/kmp_8200c.pdf; Operating Temperature: -40°C ~ 85°C; Design Item ID: FIXED IND 10UH 500MA 400 MOHM SMD; ComponentLink1URL: http://www.murata-ps.com/data/magnetics/kmp_8200c.pdf
footprint IND 6.6MM_7.1MM
footprint CI3225
pins: 1, 2

## CMP-011-000018-1
designator L?, comment FIXED IND 2.2mH 250MA 6.2 OHM SMD  Case/Package: SM_7.0x7.8x5mm  Tolerance: 20%  Core Material: Ferrite  Min Operating Temperature: -40°C  Max Operating Temperature: 125°C  Inductance: 2.2mH
2.2MH ±20% 250MA 6.2Ω SMD,7X7.8X5MM POWER INDUCTORS ROHS; Manufacturer Part Number 1: APC07A50M222; Manufacturer 1: COILANK INTERNATIONAL; DC Resistance (DCR): 6.2R; RoHS: Yes; Termination: SMD/SMT; Weight: 0.002116oz; ComponentLink1Description: https://datasheet.lcsc.com/szlcsc/1912111437_COILANK-INTERNATIONAL-APC07A50M222_C328284.pdf; Category: Fixed Inductors; Supplier Unit Price 1: 0.0615; Design Item ID: FIXED IND 2.2mH 250MA 6.2 OHM SMD; Mount: Surface Mount; Source: mits.SchLib; Inductance Tolerance: 20%; ComponentLink1URL: https://datasheet.lcsc.com/szlcsc/1912111437_COILANK-INTERNATIONAL-APC07A50M222_C328284.pdf; Composition: Wirewound
footprint IND 6.6MM_7.1MM
footprint INDP7870X53N (Precision Wire Wound Inductor, 2-Leads, Body 7,80x7,00mm, IPC Medium Density)
pins: 1, 2

## CMP-011-000019-1
designator L?, comment FIXED IND 33NH 300MA 800 MOHM 0603 SMD  Manufacturer: Sunlord